# Altium footprint library 排针排座.PcbLib: 344 footprints (part 6 of 22)
Each footprint in its own frame and in the unit in brackets; x right, y up, seen from the top. Pads: shape width x height; smd on the part's side, far side on the other; paste and mask are expansions set on the pad; w line width, h text height; cw(c..) or ccw(c..) is an arc to the next point about the centre after c.
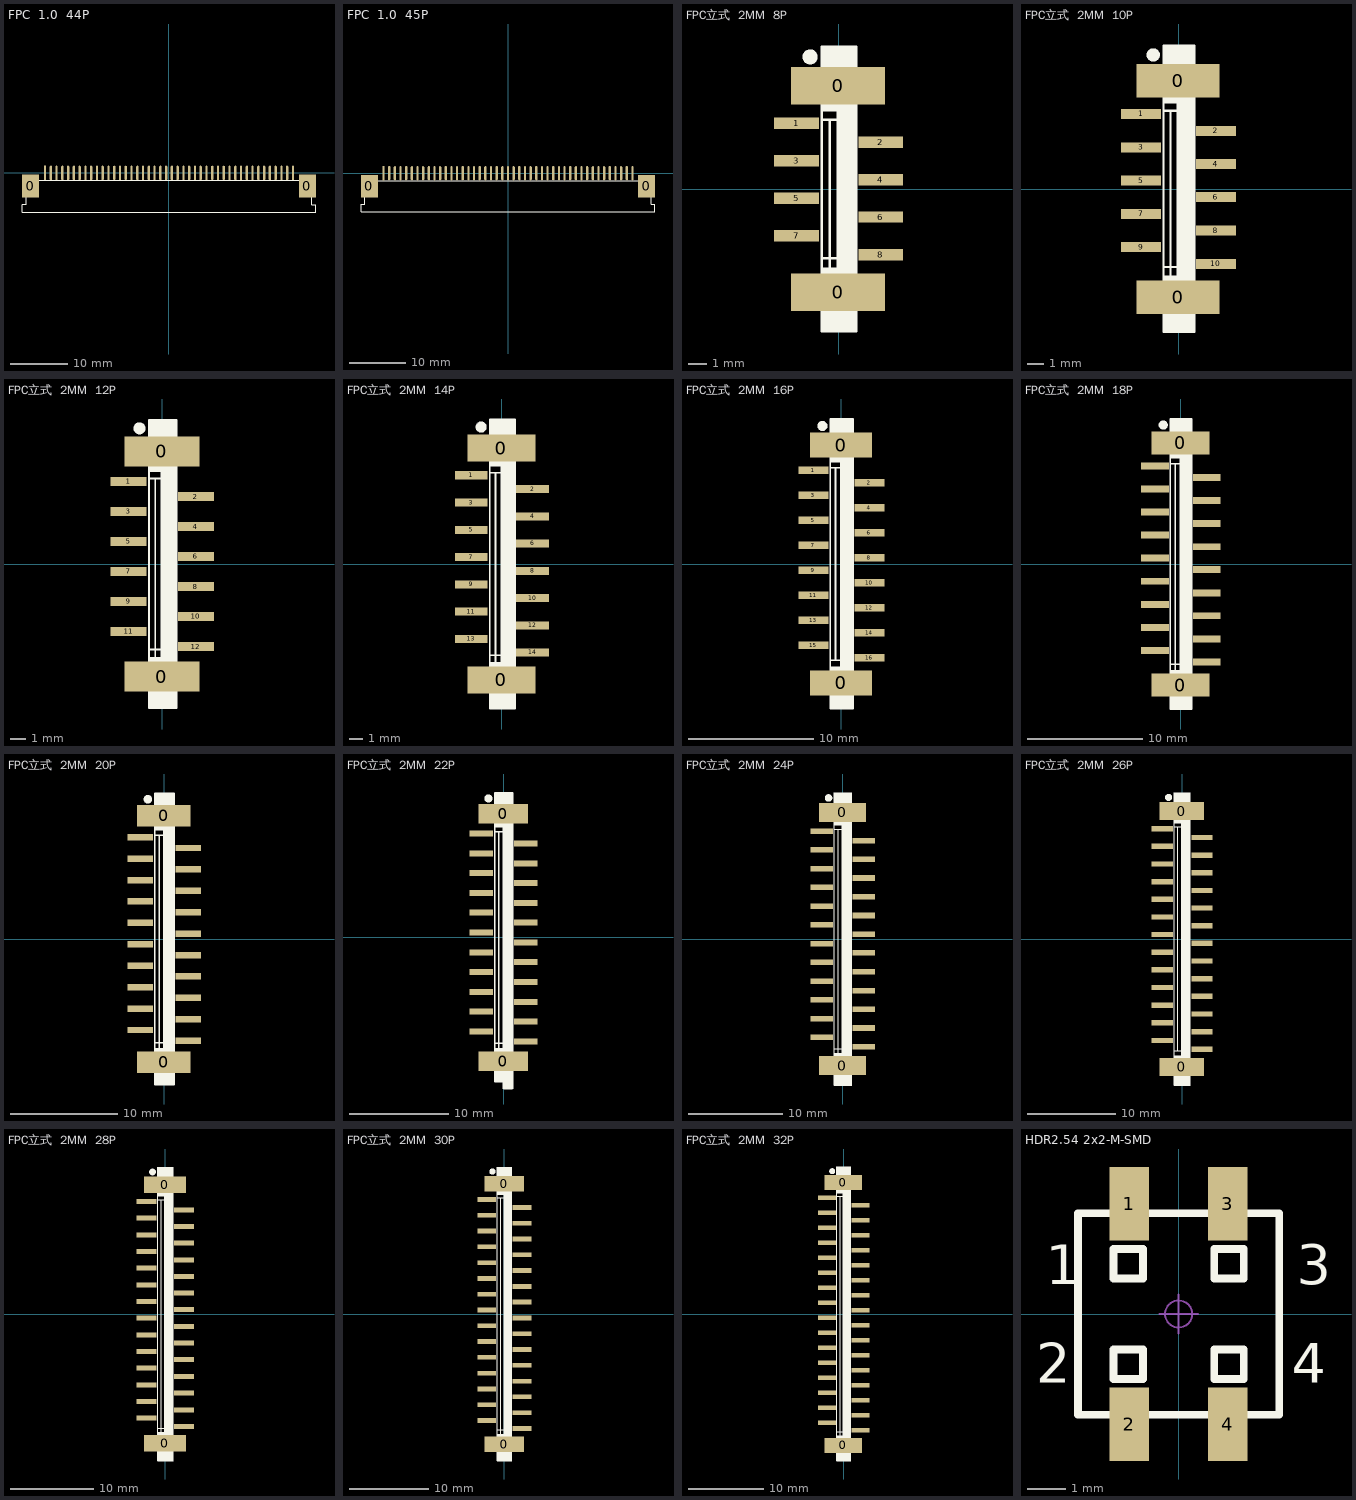
[diagram p5: the footprints below, top view; thin cyan lines are the x and y axes]

## FPC  1.0  44P [mm] "44 Pins"
height 2
pads (46):
  rect 3x4 smd: 0(-24.012,-2.289) 0(24.028,-2.289)
  rect 0.4x2.5 smd: 1(-21.492,0)
  oval 0.4x2.5 smd: 2(-20.492,0) 3(-19.492,0) 4(-18.492,0) 5(-17.492,0) 6(-16.492,0) 7(-15.492,0) 8(-14.492,0) 9(-13.492,0) 10(-12.492,0) 11(-11.492,0) 12(-10.492,0) 13(-9.492,0) 14(-8.492,0) 15(-7.492,0) 16(-6.492,0) 17(-5.492,0) 18(-4.492,0) 19(-3.492,0) 20(-2.492,0) 21(-1.492,0) 22(-0.492,0) 23(0.508,0) 24(1.508,0) 25(2.508,0) 26(3.508,0) 27(4.508,0) 28(5.508,0) 29(6.508,0) 30(7.508,0) 31(8.508,0) 32(9.508,0) 33(10.508,0) 34(11.508,0) 35(12.508,0) 36(13.508,0) 37(14.508,0) 38(15.508,0) 39(16.508,0) 40(17.508,0) 41(18.508,0) 42(19.508,0) 43(20.508,0) 44(21.508,0)
Top Overlay:
  lines w0.127: -24.785,-1.295 -24.785,-5.474 -25.393,-5.474 -25.435,-5.515 -25.435,-6.807 -25.409,-6.833 25.451,-6.833 25.451,-5.513 24.801,-5.513 24.801,-1.293 -24.785,-1.293
3D body "FPC  1.0  44P.step": height 2.4, standoff 0, extent -25.4,-6.7 25.4,0

## FPC  1.0  45P [mm] "45 Pins"
height 2
pads (47):
  rect 3x4 smd: 0(-24.52,-2.289) 0(24.52,-2.289)
  rect 0.4x2.5 smd: 1(-22,0)
  oval 0.4x2.5 smd: 2(-21,0) 3(-20,0) 4(-19,0) 5(-18,0) 6(-17,0) 7(-16,0) 8(-15,0) 9(-14,0) 10(-13,0) 11(-12,0) 12(-11,0) 13(-10,0) 14(-9,0) 15(-8,0) 16(-7,0) 17(-6,0) 18(-5,0) 19(-4,0) 20(-3,0) 21(-2,0) 22(-1,0) 23(0,0) 24(1,0) 25(2,0) 26(3,0) 27(4,0) 28(5,0) 29(6,0) 30(7,0) 31(8,0) 32(9,0) 33(10,0) 34(11,0) 35(12,0) 36(13,0) 37(14,0) 38(15,0) 39(16,0) 40(17,0) 41(18,0) 42(19,0) 43(20,0) 44(21,0) 45(22,0)
Top Overlay:
  lines w0.127: -25.293,-1.295 -25.293,-5.474 -25.901,-5.474 -25.943,-5.515 -25.943,-6.807 -25.917,-6.833 25.943,-6.833 25.943,-5.513 25.293,-5.513 25.293,-1.293 -25.293,-1.293
3D body "FPC  1.0  45P.step": height 2.4, standoff 0, extent -25.9,-6.7 25.9,0

## FPC立式  2MM  8P [mm] "连接DSP"
pads (10):
  rect 5x2 smd: 0(-0.035,-5.505) 0(-0.035,5.505)
  rect 2.4x0.6 smd: 1(-2.245,3.505) 2(2.245,2.495) 3(-2.245,1.505) 4(2.245,0.495) 5(-2.245,-0.495) 6(2.245,-1.495) 7(-2.245,-2.495) 8(2.245,-3.505)
Top Overlay:
  circle w0.4: c-1.524,7.049 r0.2
  region: -0.9,7.608 -0.9,4.2 0.914,4.2 0.914,7.608
  region: -0.025,4.2 -0.025,-7.593 0.914,-7.593 0.914,4.2
  region: 0.9,-7.598 0.9,-4.19 -0.914,-4.19 -0.914,-7.598
  lines w0.127: -0.9,-3.69 0.138,-3.69 ; -0.9,3.7 -0.05,3.7 ; -0.9,4.2 -0.05,4.2 -0.05,-7.593 ; -0.475,-7.593 -0.475,3.7 ; -0.9,-7.593 0.95,-7.593 0.95,7.607 -0.9,7.607 -0.9,-7.593
3D body "DSP 8P.step": height 5.7, standoff 0, extent -2.108,-7.6 2.012,7.6

## FPC立式  2MM  10P [mm] "连DSP"
pads (12):
  rect 5x2 smd: 0(-0.035,-6.505) 0(-0.035,6.505)
  rect 2.4x0.6 smd: 1(-2.245,4.505) 2(2.245,3.495) 3(-2.245,2.505) 4(2.245,1.495) 5(-2.245,0.505) 6(2.245,-0.495) 7(-2.245,-1.495) 8(2.245,-2.505) 9(-2.245,-3.495) 10(2.245,-4.495)
Top Overlay:
  circle w0.4: c-1.524,8.049 r0.2
  region: -0.9,8.608 -0.9,5.2 0.914,5.2 0.914,8.608
  region: -0.025,5.2 -0.025,-8.468 0.914,-8.468 0.914,5.2
  region: 0.9,-8.598 0.9,-5.19 -0.914,-5.19 -0.914,-8.598
  lines w0.127: -0.9,-4.69 0.138,-4.69 ; -0.9,4.7 -0.05,4.7 ; -0.9,5.2 -0.05,5.2 -0.05,-8.595 ; -0.475,-8.593 -0.475,4.7 ; -0.9,-8.593 0.95,-8.593 0.95,8.607 -0.9,8.607 -0.9,-8.593
3D body "DSP 10P.step": height 5.7, standoff 0, extent -2.108,-8.6 2.012,8.6

## FPC立式  2MM  12P [mm] "连DSP"
pads (14):
  rect 5x2 smd: 0(-0.035,-7.505) 0(-0.035,7.505)
  rect 2.4x0.6 smd: 1(-2.245,5.505) 2(2.245,4.495) 3(-2.245,3.505) 4(2.245,2.495) 5(-2.245,1.505) 6(2.245,0.505) 7(-2.245,-0.495) 8(2.245,-1.505) 9(-2.245,-2.495) 10(2.245,-3.495) 11(-2.245,-4.495) 12(2.245,-5.505)
Top Overlay:
  circle w0.4: c-1.524,9.049 r0.2
  region: -0.9,9.608 -0.9,6.2 0.914,6.2 0.914,9.608
  region: -0.025,6.2 -0.025,-9.433 0.914,-9.433 0.914,6.2
  region: 0.9,-9.598 0.9,-6.19 -0.914,-6.19 -0.914,-9.598
  lines w0.127: -0.9,-5.69 0.138,-5.69 ; -0.9,5.7 -0.05,5.7 ; -0.9,6.2 -0.05,6.2 -0.05,-9.598 ; -0.475,-9.593 -0.475,5.7 ; 0.95,-9.598 0.95,9.607 -0.9,9.607 -0.9,-9.593 0.95,-9.593
3D body "DSP 12P.step": height 5.7, standoff 0, extent -2.108,-9.6 2.012,9.6

## FPC立式  2MM  14P [mm] "连DSP"
pads (16):
  rect 5x2 smd: 0(-0.035,-8.505) 0(-0.035,8.505)
  rect 2.4x0.6 smd: 1(-2.245,6.505) 2(2.245,5.495) 3(-2.245,4.505) 4(2.245,3.495) 5(-2.245,2.505) 6(2.245,1.505) 7(-2.245,0.505) 8(2.245,-0.505) 9(-2.245,-1.495) 10(2.245,-2.495) 11(-2.245,-3.495) 12(2.245,-4.505) 13(-2.245,-5.495) 14(2.245,-6.485)
Top Overlay:
  circle w0.4: c-1.524,10.049 r0.2
  region: 0.9,-10.598 0.9,-7.19 -0.914,-7.19 -0.914,-10.598
  region: -0.025,7.2 -0.025,-10.474 0.914,-10.474 0.914,7.2
  region: -0.9,10.608 -0.9,7.2 0.914,7.2 0.914,10.608
  lines w0.127: -0.9,-10.598 -0.9,10.607 0.95,10.607 0.95,-10.598 ; -0.9,-10.593 0.95,-10.593 ; -0.9,-6.69 0.138,-6.69 ; -0.9,6.7 -0.05,6.7 ; -0.9,7.2 -0.05,7.2 -0.05,-9.2 ; -0.475,-8.646 -0.475,6.7
3D body "DSP 14P.step": height 5.7, standoff 0, extent -2.108,-10.6 2.012,10.6

## FPC立式  2MM  16P [mm] "连DSP"
pads (18):
  rect 5x2 smd: 0(-0.035,-9.505) 0(-0.035,9.505)
  rect 2.4x0.6 smd: 1(-2.245,7.505) 2(2.245,6.495) 3(-2.245,5.505) 4(2.245,4.495) 5(-2.245,3.505) 6(2.245,2.505) 7(-2.245,1.505) 8(2.245,0.495) 9(-2.245,-0.495) 10(2.245,-1.495) 11(-2.245,-2.495) 12(2.245,-3.505) 13(-2.245,-4.495) 14(2.245,-5.485) 15(-2.245,-6.495) 16(2.245,-7.495)
Top Overlay:
  circle w0.4: c-1.524,11.049 r0.2
  region: 0.9,-11.598 0.9,-8.19 -0.914,-8.19 -0.914,-11.598
  region: -0.025,8.2 -0.025,-11.593 0.914,-11.593 0.914,8.2
  region: -0.9,11.608 -0.9,8.2 0.914,8.2 0.914,11.608
  lines w0.127: -0.9,-7.69 0.138,-7.69 ; -0.9,7.7 -0.05,7.7 ; -0.9,8.2 -0.05,8.2 -0.05,-8.2 ; -0.475,-7.646 -0.475,7.7 ; -0.9,-11.593 -0.9,11.607 0.95,11.607 0.95,-11.593 -0.9,-11.593
3D body "DSP 16P.step": height 5.7, standoff 0, extent -2.108,-11.6 2.012,11.6

## FPC立式  2MM  18P [mm] "连DSP"
height 1.5
pads (20):
  rect 5x2 smd: 0(-0.035,-10.505) 0(-0.035,10.505)
  rect 2.4x0.6 smd: 1(-2.245,8.505) 2(2.245,7.495) 3(-2.245,6.505) 4(2.245,5.495) 5(-2.245,4.505) 6(2.245,3.505) 7(-2.245,2.505) 8(2.245,1.495) 9(-2.245,0.505) 10(2.245,-0.495) 11(-2.245,-1.495) 12(2.245,-2.505) 13(-2.245,-3.495) 14(2.245,-4.485) 15(-2.245,-5.495) 16(2.245,-6.495) 17(-2.245,-7.495) 18(2.245,-8.505)
Top Overlay:
  circle w0.4: c-1.524,12.049 r0.2
  region: -0.9,12.608 -0.9,9.2 0.914,9.2 0.914,12.608
  region: -0.021,9.2 -0.021,-12.363 0.919,-12.363 0.919,9.2
  region: 0.9,-12.598 0.9,-9.19 -0.914,-9.19 -0.914,-12.598
  lines w0.127: -0.901,-8.693 0.138,-8.693 ; -0.9,8.7 -0.05,8.7 ; -0.9,9.2 -0.05,9.2 -0.05,-12.592 ; -0.475,-12.593 -0.475,8.7 ; 0.95,-12.593 -0.9,-12.593 -0.901,12.607 0.95,12.607 0.95,-12.592
3D body "DSP 18P.step": height 5.7, standoff 0, extent -2.083,-12.6 2.037,12.6

## FPC立式  2MM  20P [mm] "连DSP"
height 1.5
pads (22):
  rect 5x2 smd: 0(-0.035,-11.505) 0(-0.035,11.505)
  rect 2.4x0.6 smd: 1(-2.245,9.505) 2(2.245,8.495) 3(-2.245,7.505) 4(2.245,6.495) 5(-2.245,5.505) 6(2.245,4.505) 7(-2.245,3.505) 8(2.245,2.495) 9(-2.245,1.505) 10(2.245,0.505) 11(-2.245,-0.495) 12(2.245,-1.505) 13(-2.245,-2.495) 14(2.245,-3.485) 15(-2.245,-4.495) 16(2.245,-5.495) 17(-2.245,-6.495) 18(2.245,-7.505) 19(-2.245,-8.495) 20(2.245,-9.485)
Top Overlay:
  circle w0.4: c-1.524,13.049 r0.2
  region: -0.9,13.608 -0.9,10.2 0.914,10.2 0.914,13.608
  region: -0.021,10.2 -0.021,-13.598 0.919,-13.598 0.919,10.2
  region: 0.9,-13.598 0.9,-10.19 -0.914,-10.19 -0.914,-13.598
  lines w0.127: -0.901,-9.693 0.138,-9.693 ; -0.9,9.7 -0.05,9.7 ; -0.9,10.2 -0.05,10.2 -0.05,-13.593 ; -0.475,-13.593 -0.475,9.7 ; -0.9,-13.593 0.95,-13.593 0.95,13.607 -0.901,13.607 -0.901,-13.593
3D body "DSP 20P.step": height 5.7, standoff 0, extent -2.108,-13.6 2.012,13.6

## FPC立式  2MM  22P [mm] "连DSP"
height 1.5
pads (24):
  rect 5x2 smd: 0(-0.035,-12.505) 0(-0.035,12.505)
  rect 2.4x0.6 smd: 1(-2.245,10.505) 2(2.245,9.495) 3(-2.245,8.505) 4(2.245,7.495) 5(-2.245,6.505) 6(2.245,5.505) 7(-2.245,4.505) 8(2.245,3.495) 9(-2.245,2.505) 10(2.245,1.505) 11(-2.245,0.505) 12(2.245,-0.505) 13(-2.245,-1.495) 14(2.245,-2.485) 15(-2.245,-3.495) 16(2.245,-4.495) 17(-2.245,-5.495) 18(2.245,-6.505) 19(-2.245,-7.495) 20(2.245,-8.485) 21(-2.245,-9.495) 22(2.245,-10.495)
Top Overlay:
  circle w0.4: c-1.524,14.049 r0.2
  region: -0.9,14.608 -0.9,11.2 0.914,11.2 0.914,14.608
  region: -0.021,11.2 -0.021,-15.353 0.919,-15.353 0.919,11.2
  region: 0.9,-14.598 0.9,-11.19 -0.914,-11.19 -0.914,-14.598
  lines w0.127: -0.901,-14.598 -0.901,14.607 0.95,14.607 0.95,-15.31 ; -0.9,-14.593 0.95,-14.593 ; -0.901,-10.693 0.138,-10.693 ; -0.9,10.7 -0.05,10.7 ; -0.9,11.2 -0.05,11.2 -0.05,-15.31 ; -0.475,-14.573 -0.475,10.7
3D body "DSP 22P.step": height 5.7, standoff 0, extent -2.111,-14.58 2.009,14.62

## FPC立式  2MM  24P [mm] "连DSP"
height 1.5
pads (26):
  rect 5x2 smd: 0(-0.035,-13.505) 0(-0.035,13.505)
  rect 2.4x0.6 smd: 1(-2.245,11.505) 2(2.245,10.495) 3(-2.245,9.505) 4(2.245,8.495) 5(-2.245,7.505) 6(2.245,6.505) 7(-2.245,5.505) 8(2.245,4.495) 9(-2.245,3.505) 10(2.245,2.505) 11(-2.245,1.505) 12(2.245,0.495) 13(-2.245,-0.495) 14(2.245,-1.485) 15(-2.245,-2.495) 16(2.245,-3.495) 17(-2.245,-4.495) 18(2.245,-5.505) 19(-2.245,-6.495) 20(2.245,-7.485) 21(-2.245,-8.495) 22(2.245,-9.495) 23(-2.245,-10.495) 24(2.245,-11.505)
Top Overlay:
  circle w0.4: c-1.524,15.049 r0.2
  region: -0.9,15.608 -0.9,12.2 0.914,12.2 0.914,15.608
  region: -0.021,12.2 -0.021,-14.353 0.919,-14.353 0.919,12.2
  region: 0.9,-15.598 0.9,-12.19 -0.914,-12.19 -0.914,-15.598
  lines w0.127: -0.901,-11.693 0.138,-11.693 ; -0.9,11.7 -0.05,11.7 ; -0.9,12.2 -0.05,12.2 -0.05,-14.353 ; -0.475,-13.693 -0.475,11.7 ; -0.9,-15.593 0.95,-15.593 0.95,15.607 -0.901,15.607 -0.901,-15.593
3D body "DSP 24P.step": height 5.7, standoff 0, extent -2.108,-15.6 2.012,15.6

## FPC立式  2MM  26P [mm] "连DSP"
height 1.5
pads (28):
  rect 5x2 smd: 0(-0.035,-14.505) 0(-0.035,14.505)
  rect 2.4x0.6 smd: 1(-2.245,12.505) 2(2.245,11.495) 3(-2.245,10.505) 4(2.245,9.495) 5(-2.245,8.505) 6(2.245,7.505) 7(-2.245,6.505) 8(2.245,5.495) 9(-2.245,4.505) 10(2.245,3.505) 11(-2.245,2.505) 12(2.245,1.495) 13(-2.245,0.505) 14(2.245,-0.485) 15(-2.245,-1.495) 16(2.245,-2.495) 17(-2.245,-3.495) 18(2.245,-4.505) 19(-2.245,-5.495) 20(2.245,-6.485) 21(-2.245,-7.495) 22(2.245,-8.495) 23(-2.245,-9.495) 24(2.245,-10.505) 25(-2.245,-11.495) 26(2.245,-12.495)
Top Overlay:
  circle w0.4: c-1.524,16.049 r0.2
  region: 0.9,-16.598 0.9,-13.19 -0.914,-13.19 -0.914,-16.598
  region: -0.021,13.2 -0.021,-13.353 0.919,-13.353 0.919,13.2
  region: -0.9,16.608 -0.9,13.2 0.914,13.2 0.914,16.608
  lines w0.127: -0.901,-12.693 0.138,-12.693 ; -0.9,12.7 -0.05,12.7 ; -0.9,13.2 -0.05,13.2 -0.05,-13.353 ; -0.475,-12.693 -0.475,12.7 ; 0.95,-16.593 -0.9,-16.593 -0.901,16.607 0.95,16.607 0.95,-16.579
3D body "DSP 26P_2.step": height 5.7, standoff 0, extent -2.108,-16.6 2.012,16.6

## FPC立式  2MM  28P [mm] "连DSP"
height 1.5
pads (30):
  rect 5x2 smd: 0(-0.035,-15.505) 0(-0.035,15.505)
  rect 2.4x0.6 smd: 1(-2.245,13.505) 2(2.245,12.495) 3(-2.245,11.505) 4(2.245,10.495) 5(-2.245,9.505) 6(2.245,8.505) 7(-2.245,7.505) 8(2.245,6.495) 9(-2.245,5.505) 10(2.245,4.505) 11(-2.245,3.505) 12(2.245,2.495) 13(-2.245,1.505) 14(2.245,0.515) 15(-2.245,-0.495) 16(2.245,-1.495) 17(-2.245,-2.495) 18(2.245,-3.505) 19(-2.245,-4.495) 20(2.245,-5.485) 21(-2.245,-6.495) 22(2.245,-7.495) 23(-2.245,-8.495) 24(2.245,-9.505) 25(-2.245,-10.495) 26(2.245,-11.495) 27(-2.245,-12.495) 28(2.245,-13.505)
Top Overlay:
  circle w0.4: c-1.524,17.049 r0.2
  region: 0.9,-17.598 0.9,-14.19 -0.914,-14.19 -0.914,-17.598
  region: -0.021,14.2 -0.021,-14.443 0.919,-14.443 0.919,14.2
  region: -0.9,17.608 -0.9,14.2 0.914,14.2 0.914,17.608
  lines w0.127: -0.901,-13.693 0.138,-13.693 ; -0.9,13.7 -0.05,13.7 ; -0.9,14.2 -0.05,14.2 -0.05,-14.291 ; -0.475,-14.215 -0.475,13.7 ; -0.901,-17.593 -0.901,17.607 0.95,17.607 0.95,-17.593 -0.9,-17.593
3D body "DSP 28P.step": height 5.7, standoff 0, extent -2.085,-17.602 2.035,17.598

## FPC立式  2MM  30P [mm] "连DSP"
height 1.5
pads (32):
  rect 5x2 smd: 0(-0.035,-16.505) 0(-0.035,16.505)
  rect 2.4x0.6 smd: 1(-2.245,14.505) 2(2.245,13.495) 3(-2.245,12.505) 4(2.245,11.495) 5(-2.245,10.505) 6(2.245,9.505) 7(-2.245,8.505) 8(2.245,7.495) 9(-2.245,6.505) 10(2.245,5.505) 11(-2.245,4.505) 12(2.245,3.495) 13(-2.245,2.505) 14(2.245,1.515) 15(-2.245,0.505) 16(2.245,-0.495) 17(-2.245,-1.495) 18(2.245,-2.505) 19(-2.245,-3.495) 20(2.245,-4.485) 21(-2.245,-5.495) 22(2.245,-6.495) 23(-2.245,-7.495) 24(2.245,-8.505) 25(-2.245,-9.495) 26(2.245,-10.495) 27(-2.245,-11.495) 28(2.245,-12.505) 29(-2.245,-13.495) 30(2.245,-14.495)
Top Overlay:
  circle w0.4: c-1.524,18.049 r0.2
  region: -0.9,18.608 -0.9,15.2 0.914,15.2 0.914,18.608
  region: -0.021,15.2 -0.021,-15.383 0.919,-15.383 0.919,15.2
  region: 0.9,-18.598 0.9,-15.19 -0.914,-15.19 -0.914,-18.598
  lines w0.127: -0.901,-14.693 0.138,-14.693 ; -0.9,14.7 -0.05,14.7 ; -0.9,15.2 -0.05,15.2 -0.05,-15.383 ; -0.475,-15.332 -0.475,14.7 ; -0.9,-18.593 0.95,-18.593 0.95,18.607 -0.901,18.607 -0.901,-18.593
3D body "DSP 30P.step": height 5.7, standoff 0, extent -2.083,-18.6 2.037,18.6

## FPC立式  2MM  32P [mm] "连DSP"
height 1.5
pads (34):
  rect 5x2 smd: 0(-0.035,-17.505) 0(-0.035,17.505)
  rect 2.4x0.6 smd: 1(-2.245,15.505) 2(2.245,14.495) 3(-2.245,13.505) 4(2.245,12.495) 5(-2.245,11.505) 6(2.245,10.505) 7(-2.245,9.505) 8(2.245,8.495) 9(-2.245,7.505) 10(2.245,6.505) 11(-2.245,5.505) 12(2.245,4.495) 13(-2.245,3.505) 14(2.245,2.515) 15(-2.245,1.505) 16(2.245,0.505) 17(-2.245,-0.495) 18(2.245,-1.505) 19(-2.245,-2.495) 20(2.245,-3.485) 21(-2.245,-4.495) 22(2.245,-5.495) 23(-2.245,-6.495) 24(2.245,-7.505) 25(-2.245,-8.495) 26(2.245,-9.495) 27(-2.245,-10.495) 28(2.245,-11.505) 29(-2.245,-12.495) 30(2.245,-13.495) 31(-2.245,-14.495) 32(2.245,-15.505)
Top Overlay:
  circle w0.4: c-1.524,19.049 r0.2
  region: -0.9,19.608 -0.9,16.2 0.914,16.2 0.914,19.608
  region: -0.021,16.2 -0.021,-16.856 0.919,-16.856 0.919,16.2
  region: 0.9,-19.598 0.9,-16.19 -0.914,-16.19 -0.914,-19.598
  lines w0.127: -0.901,-15.693 0.138,-15.693 ; -0.9,15.7 -0.05,15.7 ; -0.9,16.2 -0.05,16.2 -0.05,-16.348 ; -0.475,-16.348 -0.475,15.7 ; -0.9,-19.593 0.95,-19.593 0.95,19.607 -0.901,19.607 -0.901,-19.593
3D body "DSP 34P.step": height 5.7, standoff 0, extent -2.108,-19.6 2.012,19.6

## HDR2.54 2x2-M-SMD [mm] "脚距：2.54mm，贴片双排母"
pads (4):
  rect 1.02x1.9 smd: 1(-1.27,2.85) 2(-1.27,-2.85) 3(1.27,2.85) 4(1.27,-2.85)
Top Overlay:
  lines w0.2: -2.6,-2.6 -2.6,2.6 2.6,2.6 2.6,-2.6 -2.6,-2.6 ; -1.681,-1.681 -1.681,-0.919 -0.919,-0.919 -0.919,-1.681 -1.681,-1.681 ; -1.681,0.919 -1.681,1.681 -0.919,1.681 -0.919,0.919 -1.681,0.919 ; 0.919,-1.681 0.919,-0.919 1.681,-0.919 1.681,-1.681 0.919,-1.681 ; 0.919,0.919 0.919,1.681 1.681,1.681 1.681,0.919 0.919,0.919
  text "4" at 2.921,-1.778 h1.02
  text "3" at 3.048,0.762 h1.02
  text "1" at -3.429,0.762 h1.02
  text "2" at -3.683,-1.778 h1.02
Mechanical 15:
  circle w0.05: c0,0 r0.35
  lines w0.05: -0.5,0 0.5,0 ; 0,-0.5 0,0.5
3D body "HDR2.54 2x1P_M.STEP": height 5.15, standoff 0, extent -0.03,-3.2 2.57,3.2
3D body "HDR2.54 2x1P_M.STEP": height 5.15, standoff 0, extent -2.57,-3.2 0.03,3.2